# Altium footprint library Sensors.PcbLib: 30 footprints (part 1 of 2)
Each footprint in its own frame and in the unit in brackets; x right, y up, seen from the top. Pads: shape width x height; smd on the part's side, far side on the other; paste and mask are expansions set on the pad; w line width, h text height; cw(c..) or ccw(c..) is an arc to the next point about the centre after c.
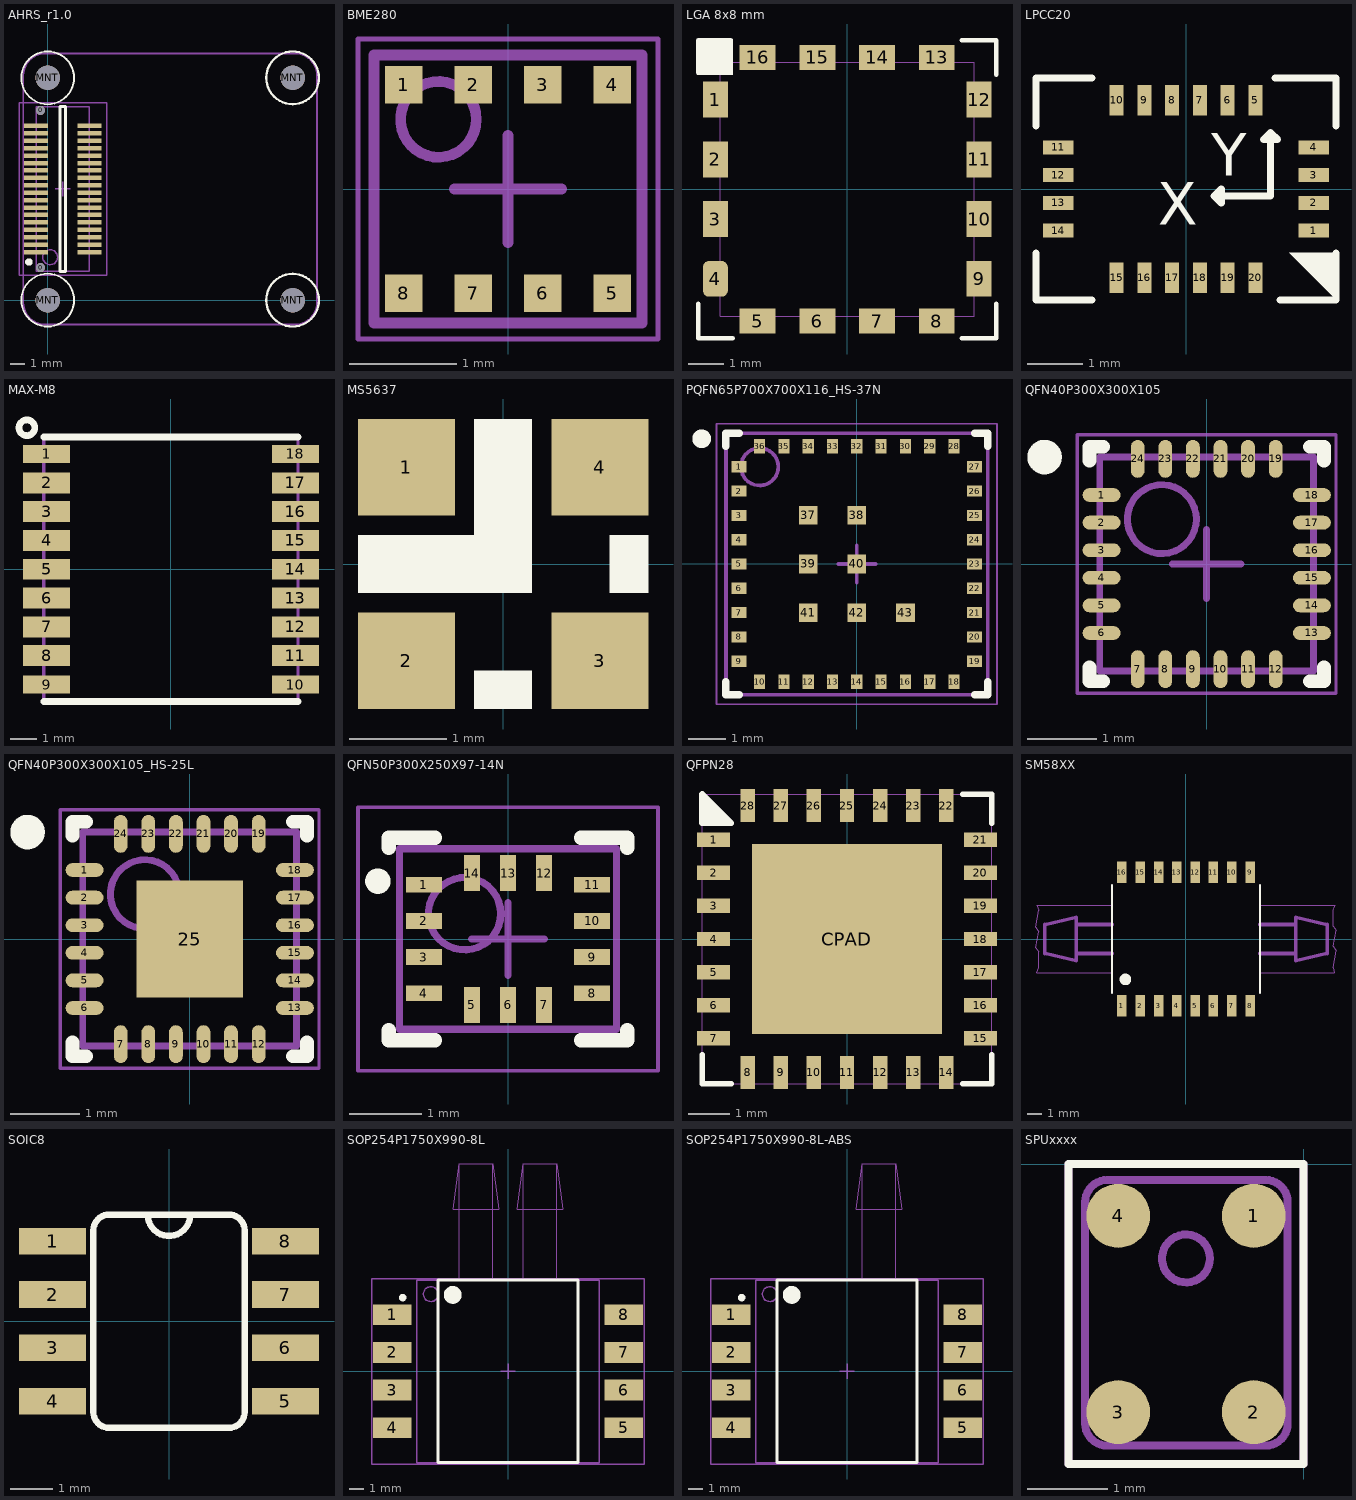
[diagram p0: the footprints below, top view; thin cyan lines are the x and y axes]

## AHRS_r1.0 [mm]
pads (42):
  round 0.6 hole 0.6 unplated: 0(-0.484,2.193) 0(-0.484,12.793)
  rect 1.6x0.3 smd: 1(-0.784,3.243) 2(2.816,3.243) 3(-0.784,3.743) 4(2.816,3.743) 5(-0.784,4.243) 6(2.816,4.243) 7(-0.784,4.743) 8(2.816,4.743) 9(-0.784,5.243) 10(2.816,5.243) 11(-0.784,5.743) 12(2.816,5.743) 13(-0.784,6.243) 14(2.816,6.243) 15(-0.784,6.743) 16(2.816,6.743) 17(-0.784,7.243) 18(2.816,7.243) 19(-0.784,7.743) 20(2.816,7.743) 21(-0.784,8.243) 22(2.816,8.243) 23(-0.784,8.743) 24(2.816,8.743) 25(-0.784,9.243) 26(2.816,9.243) 27(-0.784,9.743) 28(2.816,9.743) 29(-0.784,10.243) 30(2.816,10.243) 31(-0.784,10.743) 32(2.816,10.743) 33(-0.784,11.243) 34(2.816,11.243) 35(-0.784,11.743) 36(2.816,11.743)
  round 1.651 hole 1.651 unplated: MNT(0,0) MNT(0,14.986) MNT(16.51,0) MNT(16.51,14.986)
Top Overlay:
  circle w0.152: c16.51,0 r1.778
  circle w0.127: c0,14.986 r1.778
  circle w0.127: c0,0 r1.778
  circle w0.152: c16.51,14.986 r1.778
  circle w0.25: c-1.268,2.572 r0.125
  lines w0.2: 0.841,1.943 0.841,13.043 1.191,13.043 1.191,1.943 0.841,1.943
Bottom Overlay:
  circle w0.152: c16.51,14.986 r1.778
  circle w0.127: c0,0 r1.778
  circle w0.127: c0,14.986 r1.778
  circle w0.152: c16.51,0 r1.778
Mechanical 13:
  circle w0.1: c0.166,2.893 r0.5
  lines w0.1: -0.784,1.943 -0.784,13.043 2.816,13.043 2.816,1.943 -0.784,1.943
  lines w0.127: -1.651,15.113 -1.651,-0.14 ccw(c-0.14,-0.14) -0.14,-1.651 16.637,-1.651 ; -1.651,15.122 cw(c-0.136,15.122) -0.136,16.637 16.637,16.637 ; 16.65,-1.651 ccw(c16.65,-0.14) 18.161,-0.14 18.161,15.126 ccw(c16.65,15.126) 16.65,16.637
Mechanical 15:
  lines w0.1: 0.516,7.493 1.516,7.493 ; 1.016,6.993 1.016,7.993 ; -1.934,1.693 3.966,1.693 3.966,13.293 -1.934,13.293 -1.934,1.693
3D body "DF12D(5.0)-36DP-0.5V.stp": height 4.32, standoff -0.58, extent -1.284,1.893 3.316,13.093
3D body "AHRS_r1.0.step": height 7.1, standoff 2.79, extent -1.655,-1.657 18.171,16.646
3D body: height 7.54, standoff -2.54, extent -1.587,13.399 1.587,16.573
3D body: height 7.54, standoff -2.54, extent 14.923,13.399 18.097,16.573
3D body: height 7.54, standoff -2.54, extent 14.923,-1.587 18.097,1.587
3D body: height 7.54, standoff -2.54, extent -1.587,-1.587 1.587,1.587

## BME280 [mm] "Bosch Pressure Humidity Sensor"
height 0.1
pads (8):
  rect 0.35x0.35 smd: 1(-0.975,0.975) 2(-0.325,0.975) 3(0.325,0.975) 4(0.975,0.975) 5(0.975,-0.975) 6(0.325,-0.975) 7(-0.325,-0.975) 8(-0.975,-0.975)
Mechanical 13:
  circle w0.1: c-0.65,0.65 r0.354
  lines w0.1: -1.25,-1.25 -1.25,1.25 1.25,1.25 1.25,-1.25 -1.25,-1.25
Mechanical 15:
  lines w0.05: -1.4,-1.4 -1.4,1.4 1.4,1.4 1.4,-1.4 -1.4,-1.4
  lines w0.1: -0.5,0 0.5,0 ; 0,-0.5 0,0.5
3D body "User Library-Bosch_BME280.STEP": height 0.93, standoff 0, extent -1.25,-1.25 1.25,1.25

## LGA 8x8 mm [mm]
pads (16):
  rect 0.7x1 smd: 1(-3.686,2.505) 2(-3.686,0.835) 3(-3.686,-0.835) 9(3.686,-2.505) 10(3.686,-0.835) 11(3.686,0.835) 12(3.686,2.505)
  rrect50% 0.7x1 smd: 4(-3.686,-2.505)
  rect 1x0.7 smd: 5(-2.505,-3.687) 6(-0.835,-3.687) 7(0.835,-3.687) 8(2.505,-3.687) 13(2.505,3.687) 14(0.835,3.687) 15(-0.835,3.687) 16(-2.505,3.687)
Top Overlay:
  region: -4.2,4.2 -4.2,3.2 -3.2,3.2 -3.2,4.2
  lines w0.127: -4.163,-3.2 -4.163,-4.164 -3.2,-4.164 ; -4.163,3.251 -4.163,4.163 -3.251,4.163 ; 3.2,-4.164 4.163,-4.164 4.163,-3.2 ; 3.2,4.163 4.163,4.163 4.163,3.2
Mechanical 1:
  lines w0: -3.556,-3.556 -3.556,3.556 3.556,3.556 3.556,-3.556 -3.556,-3.556
3D body: height 3.5, standoff 0, extent -4.163,-4.163 4.163,4.163
3D body: height 4.5, standoff 0, extent -3.555,-3.555 3.555,3.555

## LPCC20 [mm] "Honeywell Mag"
pads (20):
  rect 0.55x0.25 smd: 1(2.3,-0.75) 2(2.3,-0.25) 3(2.3,0.25) 4(2.3,0.75) 11(-2.3,0.75) 12(-2.3,0.25) 13(-2.3,-0.25) 14(-2.3,-0.75)
  rect 0.25x0.55 smd: 5(1.25,1.6) 6(0.75,1.6) 7(0.25,1.6) 8(-0.25,1.6) 9(-0.75,1.6) 10(-1.25,1.6) 15(-1.25,-1.6) 16(-0.75,-1.6) 17(-0.25,-1.6) 18(0.25,-1.6) 19(0.75,-1.6) 20(1.25,-1.6)
Top Overlay:
  region: 1.863,-1.151 2.692,-1.981 2.692,-1.151
  lines w0.127: -2.7,-1.154 -2.7,-2 -1.696,-2 ; -2.7,1.132 -2.7,2 -1.696,2 ; 1.606,2 2.7,2 2.7,1.132 ; 1.696,-2 2.7,-2 2.7,-1.154 ; 0.508,-0.127 0.635,-0.254 0.635,0 0.508,-0.127 ; 0.508,-0.127 1.524,-0.127 1.524,1.016 ; 1.524,1.016 1.651,0.889 1.397,0.889 1.524,1.016
  text "X" at 0.209,-0.646 h0.76
  text "Y" at 1.098,0.243 h0.76
3D body: height 1.08, standoff 0, extent -2.5,-1.8 2.5,1.8

## MAX-M8 [mm] "ulbox M8 concurrent GNSS module"
height 2.7
pads (18):
  rect 1.8x0.7 smd paste-2: 1(-4.75,4.4) 9(-4.75,-4.4) 10(4.75,-4.4) 18(4.75,4.4)
  rect 1.8x0.8 smd paste-2: 2(-4.75,3.3) 3(-4.75,2.2) 4(-4.75,1.1) 5(-4.75,0) 6(-4.75,-1.1) 7(-4.75,-2.2) 8(-4.75,-3.3) 11(4.75,-3.3) 12(4.75,-2.2) 13(4.75,-1.1) 14(4.75,0) 15(4.75,1.1) 16(4.75,2.2) 17(4.75,3.3)
Top Overlay:
  circle w0.254: c-5.5,5.4 r0.3
  lines w0.254: -4.85,-5.05 0,-5.05 4.85,-5.05 ; -4.85,5.05 0,5.05 4.85,5.05
Top Paste:
  region: 5.65,4.75 4.85,4.75 4.85,4.05 5.65,4.05
  region: 5.65,-4.05 4.85,-4.05 4.85,-4.75 5.65,-4.75
  rectangle: -5.65,-4.75 -4.85,-4.05
  region: 4.85,2.5 3.95,2.5 3.95,1.9 4.85,1.9
  region: 4.85,1.4 3.95,1.4 3.95,0.8 4.85,0.8
  region: 4.85,0.3 3.95,0.3 3.95,-0.3 4.85,-0.3
  region: 4.85,-0.8 3.95,-0.8 3.95,-1.4 4.85,-1.4
  region: 4.85,-1.9 3.95,-1.9 3.95,-2.5 4.85,-2.5
  rectangle: -4.85,-2.5 -3.95,-1.9
  rectangle: -4.85,-1.4 -3.95,-0.8
  rectangle: -4.85,-0.3 -3.95,0.3
  rectangle: -4.85,0.8 -3.95,1.4
  rectangle: -4.85,1.9 -3.95,2.5
  region: 4.85,3.6 3.95,3.6 3.95,3 4.85,3
  region: 4.85,4.65 3.95,4.65 3.95,4.15 4.85,4.15
  rectangle: -4.85,-3.6 -3.95,-3
  rectangle: -4.85,-4.65 -3.95,-4.15
  region: 4.85,-3 3.95,-3 3.95,-3.6 4.85,-3.6
  region: 4.85,-4.15 3.95,-4.15 3.95,-4.65 4.85,-4.65
  region: 5.65,3.7 4.85,3.7 4.85,2.9 5.65,2.9
  region: 5.65,2.6 4.85,2.6 4.85,1.8 5.65,1.8
  region: 5.65,1.5 4.85,1.5 4.85,0.7 5.65,0.7
  region: 5.65,0.4 4.85,0.4 4.85,-0.4 5.65,-0.4
  region: 5.65,-0.7 4.85,-0.7 4.85,-1.5 5.65,-1.5
  region: 5.65,-1.8 4.85,-1.8 4.85,-2.6 5.65,-2.6
  region: 5.65,-2.9 4.85,-2.9 4.85,-3.7 5.65,-3.7
  rectangle: -5.65,-3.7 -4.85,-2.9
  rectangle: -5.65,-2.6 -4.85,-1.8
  rectangle: -5.65,-1.5 -4.85,-0.7
  rectangle: -5.65,4.05 -4.85,4.75
  rectangle: -4.85,4.15 -3.95,4.65
  rectangle: -5.65,2.9 -4.85,3.7
  rectangle: -4.85,3 -3.95,3.6
  rectangle: -5.65,1.8 -4.85,2.6
  rectangle: -5.65,0.7 -4.85,1.5
  rectangle: -5.65,-0.4 -4.85,0.4
Mechanical 13:
  lines w0.127: -4.85,-5.05 -4.85,5.05 0,5.05 4.85,5.05 4.85,-5.05 0,-5.05 -4.85,-5.05
3D body "MAX (STEP-AP214).step": height 2.48, standoff 0.01, extent -4.852,-5.044 4.848,5.056

## MS5637 [mm] "Barometric Pressure Sensor"
height 0.9
pads (4):
  rect 1x1 smd: 1(-1,1) 2(-1,-1) 3(1,-1) 4(1,1)
Top Overlay:
  rectangle: -0.3,-0.3 0.3,1.5
  region: 0.3,-0.3 0.3,0.3 -1.5,0.3 -1.5,-0.3
  region: 1.5,-0.3 1.5,0.3 1.1,0.3 1.1,-0.3
  rectangle: -0.3,-1.5 0.3,-1.1
3D body: height 0.9, standoff 0, extent -1.499,-1.499 1.499,1.499

## PQFN65P700X700X116_HS-37N [mm] "PQFN, 36-Leads, Body 7.00x7.00mm, Pitch 0.65mm, Thermal Pad 4.00x2.20mm, IPC Medium Density"
height 1.16
pads (43):
  rect 0.4x0.3 smd paste-0.05: 1(-3.15,2.6) 2(-3.15,1.95) 3(-3.15,1.3) 4(-3.15,0.65) 5(-3.15,0) 6(-3.15,-0.65) 7(-3.15,-1.3) 8(-3.15,-1.95) 9(-3.15,-2.6) 19(3.15,-2.6) 20(3.15,-1.95) 21(3.15,-1.3) 22(3.15,-0.65) 23(3.15,0) 24(3.15,0.65) 25(3.15,1.3) 26(3.15,1.95) 27(3.15,2.6)
  rect 0.3x0.4 smd paste-0.05: 10(-2.6,-3.15) 11(-1.95,-3.15) 12(-1.3,-3.15) 13(-0.65,-3.15) 14(0,-3.15) 15(0.65,-3.15) 16(1.3,-3.15) 17(1.95,-3.15) 18(2.6,-3.15) 28(2.6,3.15) 29(1.95,3.15) 30(1.3,3.15) 31(0.65,3.15) 32(0,3.15) 33(-0.65,3.15) 34(-1.3,3.15) 35(-1.95,3.15) 36(-2.6,3.15)
  rect 0.5x0.5 smd paste-0.05: 37(-1.3,1.3) 38(0,1.3) 39(-1.3,0) 40(0,0) 41(-1.3,-1.3) 42(0,-1.3) 43(1.3,-1.3)
Top Overlay:
  circle w0.25: c-4.15,3.35 r0.125
  lines w0.2: -3.5,-3.15 -3.5,-3.5 -3.15,-3.5 ; -3.5,3.15 -3.5,3.5 -3.15,3.5 ; 3.15,-3.5 3.5,-3.5 3.5,-3.15 ; 3.15,3.5 3.5,3.5 3.5,3.15
Mechanical 13:
  circle w0.1: c-2.6,2.6 r0.5
  lines w0.1: -3.5,-3.5 3.5,-3.5 3.5,3.5 -3.5,3.5 -3.5,-3.5
Mechanical 15:
  lines w0.05: -3.75,-3.75 3.75,-3.75 3.75,3.75 -3.75,3.75 -3.75,-3.75
  lines w0.1: -0.5,0 0.5,0 ; 0,-0.5 0,0.5
3D body: height 1.16, standoff 0, extent -3.5,-3.5 3.5,3.5

## QFN40P300X300X105 [mm] "QFN, 24-Leads, Body 3.00x3.00mm, Pitch 0.40mm, IPC High Density"
height 1.05
pads (24):
  oval 0.55x0.2 smd: 1(-1.525,1) 2(-1.525,0.6) 3(-1.525,0.2) 4(-1.525,-0.2) 5(-1.525,-0.6) 6(-1.525,-1) 13(1.525,-1) 14(1.525,-0.6) 15(1.525,-0.2) 16(1.525,0.2) 17(1.525,0.6) 18(1.525,1)
  oval 0.2x0.55 smd: 7(-1,-1.525) 8(-0.6,-1.525) 9(-0.2,-1.525) 10(0.2,-1.525) 11(0.6,-1.525) 12(1,-1.525) 19(1,1.525) 20(0.6,1.525) 21(0.2,1.525) 22(-0.2,1.525) 23(-0.6,1.525) 24(-1,1.525)
Top Overlay:
  circle w0.25: c-2.35,1.55 r0.125
  lines w0.2: -1.7,-1.5 -1.7,-1.7 -1.5,-1.7 ; -1.7,1.5 -1.7,1.7 -1.5,1.7 ; 1.5,-1.7 1.7,-1.7 1.7,-1.5 ; 1.5,1.7 1.7,1.7 1.7,1.5
Mechanical 13:
  circle w0.1: c-0.65,0.65 r0.5
  lines w0.1: -1.55,-1.55 1.55,-1.55 1.55,1.55 -1.55,1.55 -1.55,-1.55
Mechanical 15:
  lines w0.05: -1.875,-1.875 1.875,-1.875 1.875,1.875 -1.875,1.875 -1.875,-1.875
  lines w0.1: -0.5,0 0.5,0 ; 0,-0.5 0,0.5
3D body: height 1.05, standoff 0, extent -1.55,-1.55 1.55,1.55

## QFN40P300X300X105_HS-25L [mm] "QFN, 24-Leads, Body 3.00x3.00mm, Pitch 0.40mm, Thermal Pad 1.54x1.70mm, IPC High Density"
height 1.05
pads (25):
  oval 0.55x0.2 smd: 1(-1.525,1) 2(-1.525,0.6) 3(-1.525,0.2) 4(-1.525,-0.2) 5(-1.525,-0.6) 6(-1.525,-1) 13(1.525,-1) 14(1.525,-0.6) 15(1.525,-0.2) 16(1.525,0.2) 17(1.525,0.6) 18(1.525,1)
  oval 0.2x0.55 smd: 7(-1,-1.525) 8(-0.6,-1.525) 9(-0.2,-1.525) 10(0.2,-1.525) 11(0.6,-1.525) 12(1,-1.525) 19(1,1.525) 20(0.6,1.525) 21(0.2,1.525) 22(-0.2,1.525) 23(-0.6,1.525) 24(-1,1.525)
  rect 1.54x1.7 smd paste-0.25: 25(0,0)
Top Overlay:
  circle w0.25: c-2.35,1.55 r0.125
  lines w0.2: -1.7,-1.5 -1.7,-1.7 -1.5,-1.7 ; -1.7,1.5 -1.7,1.7 -1.5,1.7 ; 1.5,-1.7 1.7,-1.7 1.7,-1.5 ; 1.5,1.7 1.7,1.7 1.7,1.5
Mechanical 13:
  circle w0.1: c-0.65,0.65 r0.5
  lines w0.1: -1.55,-1.55 -1.55,1.55 1.55,1.55 1.55,-1.55 -1.55,-1.55
Mechanical 15:
  lines w0.05: -1.875,-1.875 -1.875,1.875 1.875,1.875 1.875,-1.875 -1.875,-1.875
  lines w0.1: -0.5,0 0.5,0 ; 0,-0.5 0,0.5
3D body: height 1.05, standoff 0, extent -1.55,-1.55 1.55,1.55

## QFN50P300X250X97-14N [mm] "QFN, 14-Leads, Body 3.00x2.50mm, Pitch 0.50mm, IPC Medium Density"
height 0.97
pads (14):
  rect 0.5x0.22 smd: 1(-1.162,0.75) 2(-1.162,0.25) 3(-1.162,-0.25) 4(-1.162,-0.75) 8(1.162,-0.75) 9(1.162,-0.25) 10(1.162,0.25) 11(1.162,0.75)
  rect 0.22x0.5 smd: 5(-0.5,-0.913) 6(0,-0.913) 7(0.5,-0.913) 12(0.5,0.913) 13(0,0.913) 14(-0.5,0.913)
Top Overlay:
  circle w0.25: c-1.8,0.8 r0.05
  lines w0.2: -1.65,-1.26 -1.65,-1.4 -1.01,-1.4 ; -1.65,1.26 -1.65,1.4 -1.01,1.4 ; 1.01,-1.4 1.65,-1.4 1.65,-1.26 ; 1.01,1.4 1.65,1.4 1.65,1.26
Mechanical 13:
  circle w0.1: c-0.6,0.35 r0.5
  lines w0.1: -1.5,-1.25 1.5,-1.25 1.5,1.25 -1.5,1.25 -1.5,-1.25
Mechanical 15:
  lines w0.05: -2.075,-1.825 2.075,-1.825 2.075,1.825 -2.075,1.825 -2.075,-1.825
  lines w0.1: -0.5,0 0.5,0 ; 0,-0.5 0,0.5
3D body "QFN50P300X250X97-14N.step": height 0.97, standoff 0, extent -1.58,-1.33 1.58,1.33

## QFPN28 [mm]
pads (29):
  rect 0.8x0.35 smd: 1(-3.225,2.4) 2(-3.225,1.6) 3(-3.225,0.8) 4(-3.225,0) 5(-3.225,-0.8) 6(-3.225,-1.6) 7(-3.225,-2.4) 15(3.225,-2.4) 16(3.225,-1.6) 17(3.225,-0.8) 18(3.225,0) 19(3.225,0.8) 20(3.225,1.6) 21(3.225,2.4)
  rect 0.35x0.8 smd: 8(-2.4,-3.225) 9(-1.6,-3.225) 10(-0.8,-3.225) 11(0,-3.225) 12(0.8,-3.225) 13(1.6,-3.225) 14(2.4,-3.225) 22(2.4,3.225) 23(1.6,3.225) 24(0.8,3.225) 25(0,3.225) 26(-0.8,3.225) 27(-1.6,3.225) 28(-2.4,3.225)
  rect 4.6x4.6 smd paste-1: CPAD(0,0)
Top Overlay:
  region: -3.505,3.48 -2.819,2.794 -3.505,2.794
  lines w0.127: -3.5,-2.8 -3.5,-3.5 -2.8,-3.5 ; -3.5,3.5 -3.5,2.8 -2.8,2.8 ; 2.8,-3.5 3.5,-3.5 3.5,-2.8 ; 2.8,3.5 3.5,3.5 3.5,2.8
  lines w0.15: -3.5,2.8 -3.5,3.5 -2.8,2.8 -3.5,2.8
Mechanical 1:
  lines w0: -3.5,-3.5 3.5,-3.5 3.5,3.5 -3.5,3.5 -3.5,-3.5
3D body: height 1.8, standoff 0, extent -3.499,-3.499 3.499,3.499

## SM58XX [mm]
pads (16):
  rect 0.66x1.5 smd: 1(-4.445,-4.629) 2(-3.175,-4.629) 3(-1.905,-4.629) 4(-0.635,-4.629) 5(0.635,-4.629) 6(1.905,-4.629) 7(3.175,-4.629) 8(4.445,-4.629) 9(4.445,4.629) 10(3.175,4.629) 11(1.905,4.629) 12(0.635,4.629) 13(-0.635,4.629) 14(-1.905,4.629) 15(-3.175,4.629) 16(-4.445,4.629)
Top Overlay:
  circle w0.406: c-4.2,-2.8 r0.2
  lines w0.127: -5.13,-3.76 -5.13,3.76 ; 5.13,-3.76 5.13,3.76
Mechanical 1:
  lines w0: -5.105,-2.337 -10.363,-2.337 -10.2,-2 -10.2,-0.9 -10.4,-0.6 -10.2,0.5 -10.4,0.8 -10.2,2 -10.363,2.337 -5.105,2.337 ; 5.1,-2.305 5.131,-2.337 10.287,-2.337 10.2,-2 10.4,-0.8 10.2,-0.5 10.4,0.6 10.2,0.9 10.2,2 10.312,2.261 10.338,2.337 5.131,2.337
  lines w0.254: -5.13,-1 -7.6,-1 ; -5.13,1 -7.6,1 ; 5.13,-1 7.6,-1 ; 5.13,1 7.6,1 ; -7.6,-1 -7.6,-1.5 -9.8,-1 -9.8,0 -9.8,1 -7.6,1.5 -7.6,1 ; -7.6,-1 -7.6,1 ; 7.6,-1 7.6,-1.5 9.8,-1 9.8,1 7.6,1.5 7.6,1 ; 7.6,-1 7.6,1
3D body: height 5.54, standoff 2.54, extent -9.8,-1.5 9.8,1.5
3D body: height 5.54, standoff 0, extent -5.129,-3.399 5.129,3.399
3D body: height 2.54, standoff 0, extent -5.13,-3.76 5.13,3.76

## SOIC8 [mm]
pads (8):
  rect 1.6x0.635 smd: 1(-2.773,1.905) 2(-2.773,0.635) 3(-2.773,-0.635) 4(-2.773,-1.905) 5(2.773,-1.905) 6(2.773,-0.635) 7(2.773,0.635) 8(2.773,1.905)
Top Overlay:
  lines w0.152: -0.508,2.54 ccw(c0,2.54) 0.508,2.54 ; -1.803,-2.159 ccw(c-1.422,-2.159) -1.422,-2.54 1.422,-2.54 ccw(c1.422,-2.159) 1.803,-2.159 1.803,2.159 ccw(c1.422,2.159) 1.422,2.54 -1.422,2.54 ccw(c-1.422,2.159) -1.803,2.159 -1.803,-2.159
3D body "SW3dPS-Maxim_SOIC8.step": height 1.87, standoff 0.02, extent -3.1,-2.5 3.1,2.5

## SOP254P1750X990-8L [mm] "SOP, 8-Leads, Body 12.3x12.3mm (max), Pitch 2.54mm, IPC High Density"
height 9.9
pads (8):
  rect 2.6x1.4 smd: 1(-7.8,3.81) 2(-7.8,1.27) 3(-7.8,-1.27) 4(-7.8,-3.81) 5(7.8,-3.81) 6(7.8,-1.27) 7(7.8,1.27) 8(7.8,3.81)
Top Overlay:
  circle w0.6: c-3.725,5.15 r0.3
  circle w0.25: c-7.1,4.96 r0.125
  lines w0.2: -4.725,-6.15 4.725,-6.15 4.725,6.15 -4.725,6.15 -4.725,-6.15
Mechanical 13:
  circle w0.1: c-5.2,5.2 r0.5
  lines w0.076: -3.302,6.096 -3.302,13.97 ; -1.016,6.096 -1.016,13.97 ; 1.016,6.096 1.016,13.97 ; 3.302,6.096 3.302,13.97 ; -3.302,13.97 -3.683,10.922 -0.635,10.922 -1.016,13.97 ; -3.302,13.97 -1.016,13.97 ; 1.016,13.97 0.635,10.922 3.683,10.922 3.302,13.97 ; 1.016,13.97 3.302,13.97
  lines w0.1: -6.15,-6.15 6.15,-6.15 6.15,6.15 -6.15,6.15 -6.15,-6.15
  text "TOP" at 2.54,7.112 h0.51
  text "BOTTOM" at -1.905,7.112 h0.51
Mechanical 15:
  lines w0.1: -0.5,0 0.5,0 ; 0,-0.5 0,0.5 ; -9.175,-6.25 9.175,-6.25 9.175,6.25 -9.175,6.25 -9.175,-6.25
3D body: height 9.65, standoff 0.1, extent -6.15,-6.15 6.15,6.15
3D body: height 2.29, standoff 0, extent -3.301,6.151 -1.017,10.921
3D body: height 2.29, standoff 0, extent -3.301,10.923 -1.017,13.969
3D body: height 9.53, standoff 7.24, extent 1.017,6.151 3.301,10.921
3D body: height 9.53, standoff 7.24, extent 1.017,10.923 3.301,13.969

## SOP254P1750X990-8L-ABS [mm] "SOP, 8-Leads, Body 12.3x12.3mm (max), Pitch 2.54mm, IPC High Density"
height 9.9
pads (8):
  rect 2.6x1.4 smd: 1(-7.8,3.81) 2(-7.8,1.27) 3(-7.8,-1.27) 4(-7.8,-3.81) 5(7.8,-3.81) 6(7.8,-1.27) 7(7.8,1.27) 8(7.8,3.81)
Top Overlay:
  circle w0.6: c-3.725,5.15 r0.3
  circle w0.25: c-7.1,4.96 r0.125
  lines w0.2: -4.725,-6.15 4.725,-6.15 4.725,6.15 -4.725,6.15 -4.725,-6.15
Mechanical 13:
  circle w0.1: c-5.2,5.2 r0.5
  lines w0.076: 1.016,6.096 1.016,13.97 ; 3.302,6.096 3.302,13.97 ; 1.016,13.97 0.635,10.922 3.683,10.922 3.302,13.97 ; 1.016,13.97 3.302,13.97
  lines w0.1: -6.15,-6.15 6.15,-6.15 6.15,6.15 -6.15,6.15 -6.15,-6.15
  text "TOP" at 2.54,7.112 h0.51
Mechanical 15:
  lines w0.1: -0.5,0 0.5,0 ; 0,-0.5 0,0.5 ; -9.175,-6.25 9.175,-6.25 9.175,6.25 -9.175,6.25 -9.175,-6.25
3D body: height 8.25, standoff 0.1, extent -6.15,-6.15 6.15,6.15
3D body: height 8.25, standoff 5.97, extent 1.017,6.151 3.301,10.921
3D body: height 8.25, standoff 5.97, extent 1.017,10.923 3.301,13.969

## SPUxxxx [mm] "MEMs Microphone - 3.76mm x 2.95mm x 1.20mm"
height 1.2
pads (4):
  round 0.8 smd: 1(-0.625,-0.65) 2(-0.625,-3.11) 3(-2.325,-3.11) 4(-2.325,-0.65)
Top Overlay:
  lines w0.1: -2.95,-3.76 -2.95,0 0,0 0,-3.76 -2.95,-3.76
Mechanical 13:
  circle w0.1: c-1.475,-1.184 r0.3
  lines w0.1: -2.95,-3.76 -2.95,0 0,0 0,-3.76 -2.95,-3.76 ; -2.74,-3.251 ccw(c-2.461,-3.251) -2.461,-3.53 -0.479,-3.53 ccw(c-0.479,-3.251) -0.2,-3.251 -0.2,-0.479 ccw(c-0.479,-0.479) -0.479,-0.2 -2.461,-0.2 ccw(c-2.461,-0.479) -2.74,-0.479 -2.74,-3.251
3D body: height 1.2, standoff 0, extent -1.774,-1.483 -1.176,-0.885
3D body: height 0.33, standoff 0, extent -2.949,-3.759 -0.001,-0.001
3D body: height 1.2, standoff 0, extent -2.741,-3.531 -0.199,-0.199